# Altium footprint library xhayqua.PcbLib: 185 footprints (part 5 of 12)
Each footprint in its own frame and in the unit in brackets; x right, y up, seen from the top. Pads: shape width x height; smd on the part's side, far side on the other; paste and mask are expansions set on the pad; w line width, h text height; cw(c..) or ccw(c..) is an arc to the next point about the centre after c.
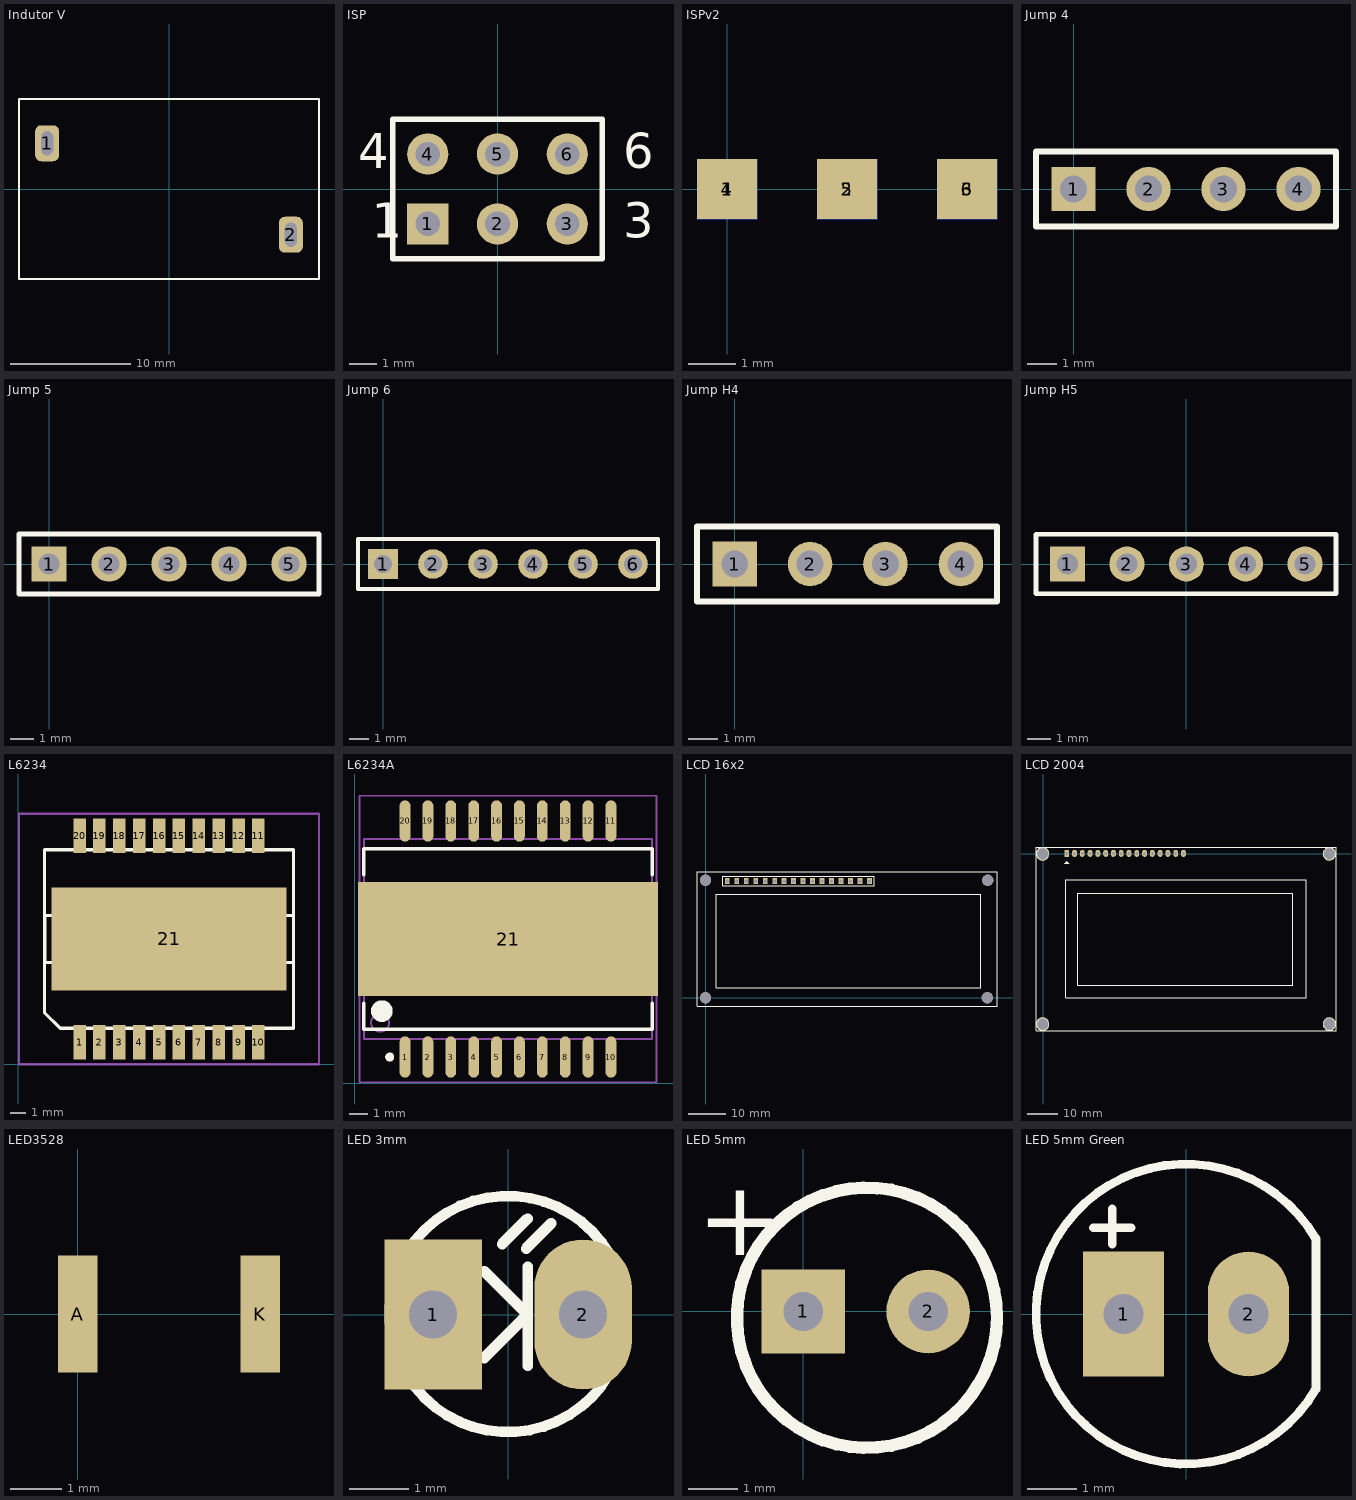
[diagram p4: the footprints below, top view; thin cyan lines are the x and y axes]

## Indutor V [mm]
pads (2):
  rrect50% 2x3 hole 1 slot 2 at 90 deg: 1(-10.16,3.81) 2(10.16,-3.81)
Top Overlay:
  lines w0.15: -12.5,-7.5 -12.5,7.5 12.5,7.5 12.5,-7.5 -12.5,-7.5
3D body "User Library-INDUCTOR - 2100HT series.STEP": height 21.92, standoff 0.08, extent -11.684,-5.207 10.16,18.923

## ISP [mm]
pads (6):
  rect 1.5x1.5 hole 0.9: 1(-2.54,-1.27)
  round 1.5 hole 0.9: 2(0,-1.27) 3(2.54,-1.27) 4(-2.54,1.27) 5(0,1.27) 6(2.54,1.27)
Top Overlay:
  lines w0.2: -3.81,-2.54 3.81,-2.54 3.81,2.54 -3.81,2.54 -3.81,-2.54
  text "6" at 4.572,0.762 h1.27
  text "3" at 4.572,-1.778 h1.27
  text "1" at -4.572,-1.778 h1.27
  text "4" at -5.08,0.762 h1.27
3D body: height 7, standoff -1, extent 2.148,-1.676 2.946,-0.88
3D body: height 7, standoff -1, extent 2.148,0.864 2.946,1.66
3D body: height 7, standoff -1, extent -0.392,-1.676 0.406,-0.88
3D body: height 7, standoff -1, extent -0.392,0.864 0.406,1.66
3D body: height 7, standoff -1, extent -2.932,-1.676 -2.134,-0.88
3D body: height 7, standoff -1, extent -2.932,0.864 -2.134,1.66
3D body: height 1.5, standoff 0, extent -3.81,-2.54 -1.27,0
3D body: height 1.5, standoff 0, extent -1.27,-2.54 1.27,0
3D body: height 1.5, standoff 0, extent 1.27,-2.54 3.81,0
3D body: height 1.5, standoff 0, extent 1.27,0 3.81,2.54
3D body: height 1.5, standoff 0, extent -1.27,0 1.27,2.54
3D body: height 1.5, standoff 0, extent -3.81,0 -1.27,2.54

## ISPv2 [mm]
pads (6):
  rect 1.27x1.27 smd: 1(0,0) 2(2.54,0) 3(5.08,0)
  rect 1.27x1.27 smd far side: 4(0,0) 5(2.54,0) 6(5.08,0)

## Jump 4 [mm]
pads (4):
  rect 1.5x1.5 hole 0.9: 1(0,0)
  round 1.5 hole 0.9: 2(2.54,0) 3(5.08,0) 4(7.62,0)
Top Overlay:
  lines w0.2: -1.27,-1.27 -1.27,1.27 8.89,1.27 8.89,-1.27 -1.27,-1.27
3D body: height 7, standoff -1, extent -0.406,-0.406 0.39,0.392
3D body: height 1.5, standoff 0, extent -1.27,-1.27 1.27,1.27
3D body: height 7, standoff -1, extent 2.134,-0.406 2.93,0.392
3D body: height 1.5, standoff 0, extent 1.27,-1.27 3.81,1.27
3D body: height 7, standoff -1, extent 4.674,-0.406 5.47,0.392
3D body: height 1.5, standoff 0, extent 3.81,-1.27 6.35,1.27
3D body: height 7, standoff -1, extent 7.214,-0.406 8.01,0.392
3D body: height 1.5, standoff 0, extent 6.35,-1.27 8.89,1.27

## Jump 5 [mm]
pads (5):
  rect 1.5x1.5 hole 0.9: 1(0,0)
  round 1.5 hole 0.9: 2(2.54,0) 3(5.08,0) 4(7.62,0) 5(10.16,0)
Top Overlay:
  lines w0.2: -1.27,-1.27 -1.27,1.27 11.43,1.27 11.43,-1.27 -1.27,-1.27
3D body: height 7, standoff -1, extent -0.406,-0.406 0.39,0.392
3D body: height 1.5, standoff 0, extent -1.27,-1.27 1.27,1.27
3D body: height 7, standoff -1, extent 2.134,-0.406 2.93,0.392
3D body: height 1.5, standoff 0, extent 1.27,-1.27 3.81,1.27
3D body: height 7, standoff -1, extent 4.674,-0.406 5.47,0.392
3D body: height 1.5, standoff 0, extent 3.81,-1.27 6.35,1.27
3D body: height 7, standoff -1, extent 7.214,-0.406 8.01,0.392
3D body: height 1.5, standoff 0, extent 6.35,-1.27 8.89,1.27
3D body: height 7, standoff -1, extent 9.754,-0.406 10.55,0.392
3D body: height 1.5, standoff 0, extent 8.89,-1.27 11.43,1.27

## Jump 6 [mm]
pads (6):
  rect 1.5x1.5 hole 0.9: 1(0,0)
  round 1.5 hole 0.9: 2(2.54,0) 3(5.08,0) 4(7.62,0) 5(10.16,0) 6(12.7,0)
Top Overlay:
  lines w0.2: -1.27,-1.27 -1.27,1.27 13.97,1.27 13.97,-1.27 -1.27,-1.27
3D body: height 1.5, standoff 0, extent 8.89,-1.27 11.43,1.27
3D body: height 7, standoff -1, extent 9.754,-0.406 10.55,0.392
3D body: height 1.5, standoff 0, extent 6.35,-1.27 8.89,1.27
3D body: height 7, standoff -1, extent 7.214,-0.406 8.01,0.392
3D body: height 1.5, standoff 0, extent 3.81,-1.27 6.35,1.27
3D body: height 7, standoff -1, extent 4.674,-0.406 5.47,0.392
3D body: height 1.5, standoff 0, extent 1.27,-1.27 3.81,1.27
3D body: height 7, standoff -1, extent 2.134,-0.406 2.93,0.392
3D body: height 1.5, standoff 0, extent -1.27,-1.27 1.27,1.27
3D body: height 7, standoff -1, extent -0.406,-0.406 0.39,0.392
3D body: height 1.5, standoff 0, extent 11.43,-1.27 13.97,1.27
3D body: height 7, standoff -1, extent 12.294,-0.406 13.09,0.392

## Jump H4 [mm]
pads (4):
  rect 1.5x1.5 hole 0.9: 1(0,0)
  round 1.5 hole 0.9: 2(2.54,0) 3(5.08,0) 4(7.62,0)
Top Overlay:
  lines w0.2: -1.27,-1.27 8.839,-1.27 8.839,1.27 -1.27,1.27 -1.27,-1.27
3D body "HDR4.step": height 4.33, standoff -3, extent -1.295,-7 8.865,1.27

## Jump H5 [mm]
pads (5):
  rect 1.5x1.5 hole 0.9: 1(-5.08,0)
  round 1.5 hole 0.9: 2(-2.54,0) 3(0,0) 4(2.54,0) 5(5.08,0)
Top Overlay:
  lines w0.2: -6.426,-1.27 6.401,-1.27 6.401,1.27 -6.426,1.27 -6.426,-1.27
3D body "HDR5.step": height 4.33, standoff -3, extent -6.35,-1.27 6.35,7

## L6234 [mm]
pads (21):
  rect 0.8x2.2 smd: 1(3.937,1.401) 2(5.207,1.401) 3(6.477,1.401) 4(7.747,1.401) 5(9.017,1.401) 6(10.287,1.401) 7(11.557,1.401) 8(12.827,1.401) 9(14.097,1.401) 10(15.367,1.401) 11(15.367,14.601) 12(14.097,14.601) 13(12.827,14.601) 14(11.557,14.601) 15(10.287,14.601) 16(9.017,14.601) 17(7.747,14.601) 18(6.477,14.601) 19(5.207,14.601) 20(3.937,14.601)
  rect 15x6.6 smd: 21(9.652,8.001)
Top Overlay:
  lines w0.203: 1.689,3.302 1.692,6.501 1.712,6.501 ; 1.69,3.301 2.69,2.301 ; 1.712,9.501 1.712,6.501 ; 2.689,2.301 17.612,2.301 17.612,6.501 16.652,6.501 16.652,9.501 17.612,9.501 17.612,13.701 1.692,13.701 1.692,9.501 2.652,9.501 2.652,6.501 1.712,6.501 ; 17.617,6.501 17.617,9.501
Mechanical 12:
  lines w0.152: 0.064,0 19.241,0 19.241,16.002 0.064,16.002 0.064,0

## L6234A [mm]
pads (21):
  oval 0.6x2.3 smd: 1(2.794,1.451) 2(4.064,1.451) 3(5.334,1.451) 4(6.604,1.451) 5(7.874,1.451) 6(9.144,1.451) 7(10.414,1.451) 8(11.684,1.451) 9(12.954,1.451) 10(14.224,1.451) 11(14.224,14.551) 12(12.954,14.551) 13(11.684,14.551) 14(10.414,14.551) 15(9.144,14.551) 16(7.874,14.551) 17(6.604,14.551) 18(5.334,14.551) 19(4.064,14.551) 20(2.794,14.551)
  rect 16.65x6.35 smd: 21(8.509,8.001)
Top Overlay:
  circle w0.6: c1.509,4.001 r0.3
  circle w0.25: c1.944,1.451 r0.125
  lines w0.2: 0.509,4.426 0.509,3.001 16.509,3.001 16.509,4.426 ; 0.509,11.576 0.509,13.001 16.509,13.001 16.509,11.576
Mechanical 13:
  circle w0.1: c1.409,3.351 r0.5
  lines w0.1: 0.509,2.451 0.509,13.551 16.509,13.551 16.509,2.451 0.509,2.451
Mechanical 15:
  lines w0.1: 8.009,8.001 9.009,8.001 ; 8.509,7.501 8.509,8.501 ; 0.259,0.051 0.259,15.951 16.759,15.951 16.759,0.051 0.259,0.051
3D body: height 3.6, standoff 0, extent 0.509,2.451 16.509,13.551

## LCD 16x2 [mm]
pads (20):
  rect 1.3x1.6 hole 0.9: 1(5.842,31.242) 2(8.382,31.242) 3(10.922,31.242) 4(13.462,31.242) 5(16.002,31.242) 6(18.542,31.242) 7(21.082,31.242) 8(23.622,31.242) 9(26.162,31.242) 10(28.702,31.242) 11(31.242,31.242) 12(33.782,31.242) 13(36.322,31.242) 14(38.862,31.242) 15(41.402,31.242) 16(43.942,31.242)
  round 3 hole 3: ""(0,0) ""(75.565,0)
  round 3 hole 3 paste+0 mask+0: ""(0,31.496) ""(75.667,31.496)
Top Overlay:
  lines w0.2: 4.572,29.972 4.572,32.512 6.477,32.512 45.212,32.512 45.212,29.972 4.572,29.972
  lines w0.254: -2.286,-2.286 78.156,-2.286 78.156,33.782 -2.286,33.782 -2.286,-2.286 ; 2.841,2.714 73.841,2.714 73.841,27.714 2.841,27.714 2.841,2.714
3D body "User Library-LCD 16x2 WC1602A0-SFYLNC06.step": height 20.4, standoff 7.5, extent -2.17,-2.243 78.08,33.757

## LCD 2004 [mil]
pads (20):
  rect 62x90 hole 39: 1(305,5)
  oval 62x90 hole 39: 2(405,5) 3(505,5) 4(605,5) 5(705,5) 6(805,5) 7(905,5) 8(1005,5) 9(1105,5) 10(1205,5) 11(1305,5) 12(1405,5) 13(1505,5) 14(1605,5) 15(1705,5) 16(1805,5)
  round 157.48 hole 137.8: "Hole 0"(-5,-2190) "Hole 0"(-4,0) "Hole 0"(3678,-2188) "Hole 0"(3680,0)
Top Overlay:
  circle w7: c3679,-2189 r79.06
  circle w7: c3679,-1 r79.06
  circle w7: c-5,-1 r79.06
  circle w7: c-4,-2189 r79.06
  region: 305,-95 270,-130 340,-130
  lines w7: -90,-2275 -90,85 3765,85 3765,-2275 -90,-2275 ; 294,-1847 294,-332 3381,-332 3381,-1847 294,-1847 ; 444,-1690 444,-507 3210,-507 3210,-1690 444,-1690
3D body "LCD2004.x_b": height 435.04, standoff -39.37, extent -92.15,-2276.56 3766.12,85.65

## LED3528 [mil]
pads (2):
  rect 30x90 smd: A(0,0) K(140,0)
3D body "LED3528.X_B": height 74.8, standoff 0, extent 1.11,-55.12 138.9,55.12

## LED 3mm [mil]
height 100
pads (2):
  rect 65x100 hole 32: 1(-50,0)
  oval 65x100 hole 32: 2(50,0)
Top Overlay:
  lines w7: -16,-29 13,0 -16,29 ; -4,47 13,64 ; 12,44 29,61 ; 13,-34 13,32 ; 67.92,-39.35 67.92,39.84
  lines w7.01: 67.57,-39.74 cw(c-0.2,0.35) 67.72,40.19
3D body "SW3DPS-LED DIP 3MM-DEFAULT.STEP": height 255.91, standoff -78.74, extent -78.9,-74.61 58.9,75

## LED 5mm [mm]
pads (2):
  rect 1.7x1.7 hole 0.8: 1(0,0)
  round 1.7 hole 0.8: 2(2.54,0)
Top Overlay:
  circle w0.254: c1.295,-0.127 r2.644
  text "+" at -2.159,1.143 h1.52

## LED 5mm Green [mil]
height 150
pads (2):
  rect 65x100 hole 32: 1(-50,0)
  oval 65x100 hole 32: 2(50,0)
Top Overlay:
  lines w7: -74,69 -44,69 ; -59,56 -59,84 ; 103.51,60.71 ccw(c0,0) 103.94,-59.97 ; 104,-59 104,60
3D body "SW3dPS-LED green.STEP": height 386.85, standoff -67.48, extent -104.33,-103.66 104.33,105